# Altium footprint library LimeMicroAltiumLib_pcbLib_r05.PcbLib: 746 footprints (part 2 of 48)
Each footprint in its own frame and in the unit in brackets; x right, y up, seen from the top. Pads: shape width x height; smd on the part's side, far side on the other; paste and mask are expansions set on the pad; w line width, h text height; cw(c..) or ccw(c..) is an arc to the next point about the centre after c.
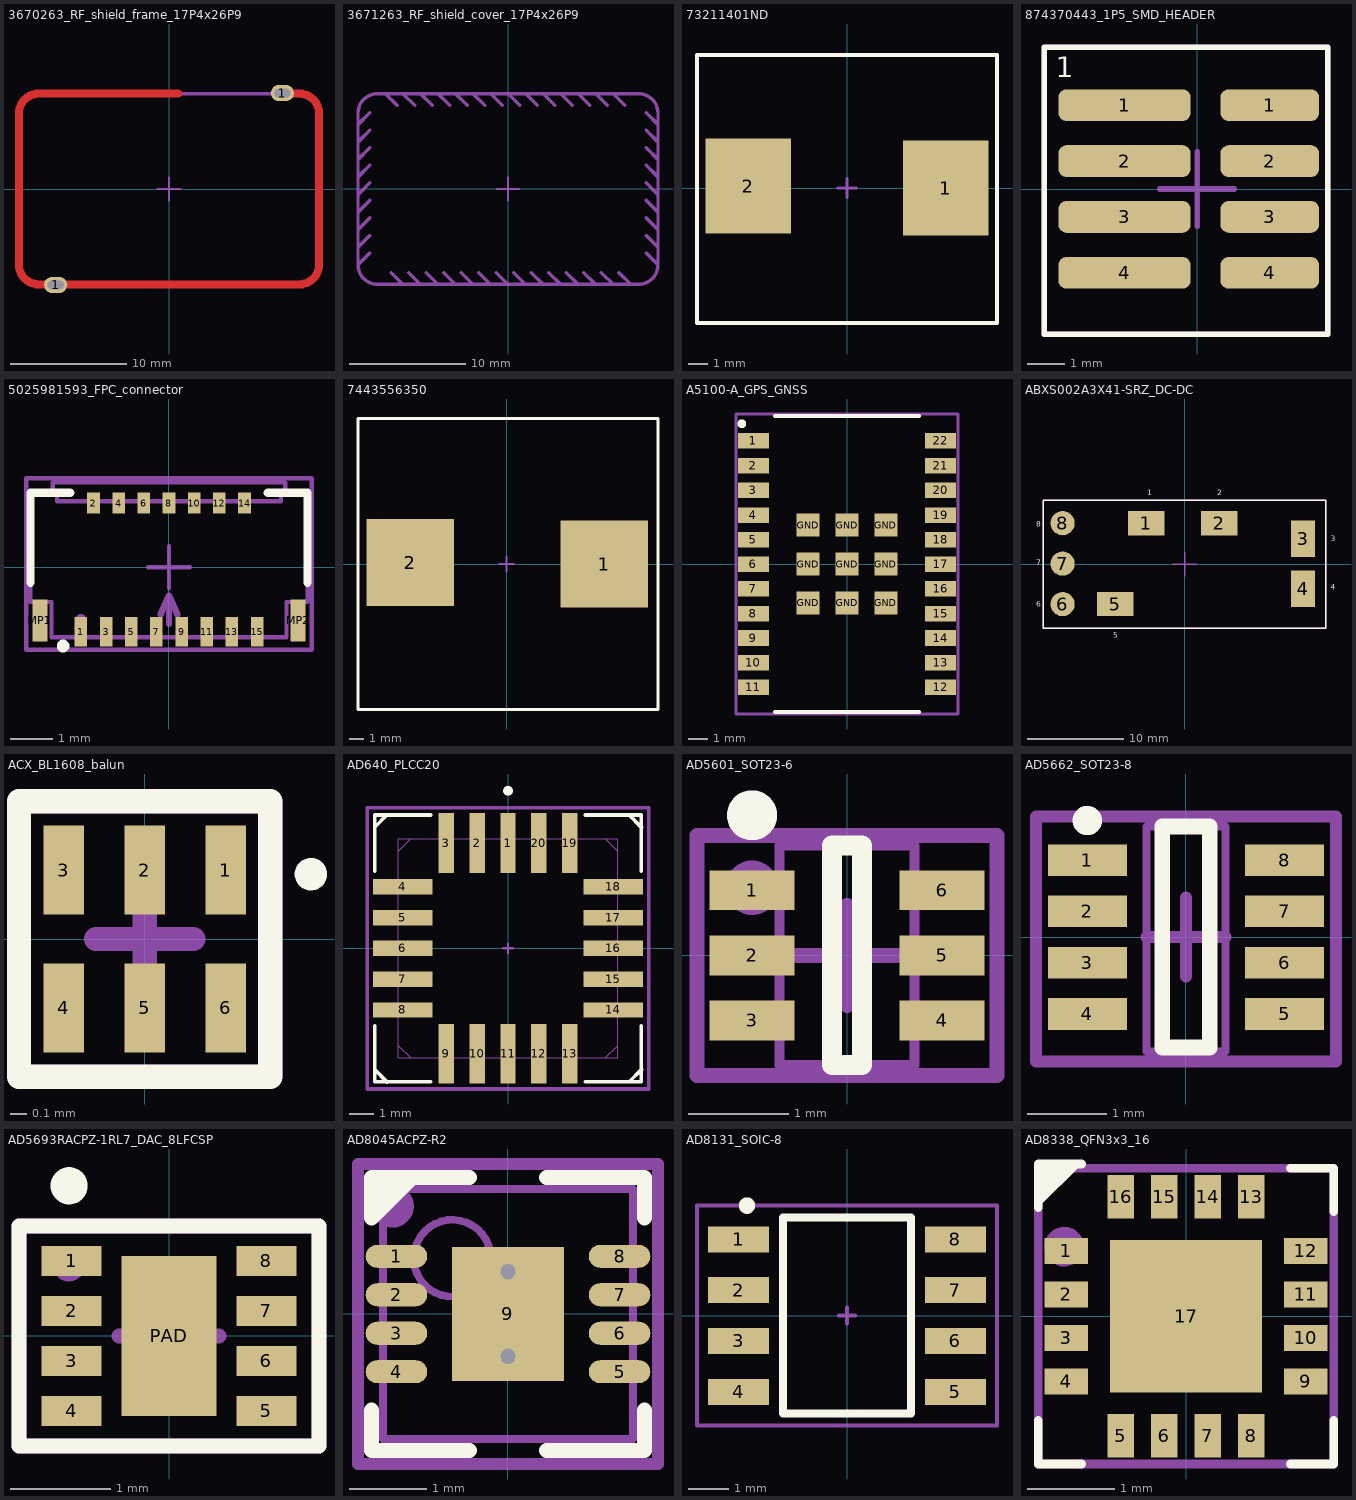
[diagram p1: the footprints below, top view; thin cyan lines are the x and y axes]

## 3670263_RF_shield_frame_17P4x26P9 [mm]
pads (2):
  oval 2x1.4 hole 0.7 slot 1.4 at 0 deg mask+0.05: 1(-9.75,-8.25) 1(9.75,8.25)
Top Layer:
  lines w0.7: 0.8,8.2 -11.207,8.2 ccw(c-11.207,6.507) -12.9,6.507 -12.9,-6.507 ccw(c-11.207,-6.507) -11.207,-8.2 11.207,-8.2 ccw(c11.207,-6.507) 12.9,-6.507 12.9,6.507 ccw(c11.207,6.507) 11.207,8.2 9.75,8.2
Mechanical 15:
  lines w0.15: -1,0 0,0 ; 0,-1 0,0 ; 0,1 0,0 ; 1,0 0,0
  lines w0.3: -12.9,-6.507 ccw(c-11.207,-6.507) -11.207,-8.2 11.207,-8.2 ccw(c11.207,-6.507) 12.9,-6.507 12.9,6.507 ccw(c11.207,6.507) 11.207,8.2 -11.207,8.2 ccw(c-11.207,6.507) -12.9,6.507 -12.9,-6.507
  text "RF shield frame" at -3.5,-7.7 h0.55
  text ".Designator" at 0,0 h0.55
3D body "STP_3670263 (rev1).stp": height 4.5, standoff -1.2, extent -13.15,-8.4 13.15,8.4

## 3671263_RF_shield_cover_17P4x26P9 [mm]
Mechanical 15:
  lines w0.15: -1,0 0,0 ; 0,-1 0,0 ; 0,1 0,0 ; 1,0 0,0
  lines w0.3: -12.9,-5 -11.9,-4 ; -12.9,-3.493 -11.9,-2.493 ; -12.9,-1.986 -11.9,-0.986 ; -12.9,-0.478 -11.9,0.522 ; -12.9,1.029 -11.9,2.029 ; -12.9,2.536 -11.9,3.536 ; -12.9,4.043 -11.9,5.043 ; -12.9,5.55 -11.9,6.55 ; -11.9,-5.507 -12.9,-6.507 ; -10.543,8.2 -9.543,7.2 ; -10.05,-7.2 -9.05,-8.2 ; -9.036,8.2 -8.036,7.2 ; -8.543,-7.2 -7.543,-8.2 ; -7.529,8.2 -6.529,7.2 ; -7.036,-7.2 -6.036,-8.2 ; -6.022,8.2 -5.022,7.2 ; -5.529,-7.2 -4.529,-8.2 ; -4.514,8.2 -3.514,7.2 ; -4.022,-7.2 -3.022,-8.2 ; -3.007,8.2 -2.007,7.2 ; -2.514,-7.2 -1.514,-8.2 ; -1.5,8.2 -0.5,7.2 ; -1.007,-7.2 -0.007,-8.2 ; 0.007,8.2 1.007,7.2 ; 0.5,-7.2 1.5,-8.2 ; 1.514,8.2 2.514,7.2 ; 2.007,-7.2 3.007,-8.2 ; 3.022,8.2 4.022,7.2 ; 3.514,-7.2 4.514,-8.2 ; 4.529,8.2 5.529,7.2 ; 5.022,-7.2 6.022,-8.2 ; 6.036,8.2 7.036,7.2 ; 6.529,-7.2 7.529,-8.2 ; 7.543,8.2 8.543,7.2 ; 8.036,-7.2 9.036,-8.2 ; 9.05,8.2 10.05,7.2 ; 9.543,-7.2 10.543,-8.2 ; 11.9,-5.507 12.9,-6.507 ; 11.9,-4 12.9,-5 ; 11.9,-2.493 12.9,-3.493 ; 11.9,-0.986 12.9,-1.986 ; 11.9,0.522 12.9,-0.478 ; 11.9,2.029 12.9,1.029 ; 11.9,3.536 12.9,2.536 ; 11.9,5.043 12.9,4.043 ; 11.9,6.55 12.9,5.55 ; -12.9,-6.507 ccw(c-11.207,-6.507) -11.207,-8.2 11.207,-8.2 ccw(c11.207,-6.507) 12.9,-6.507 ; -12.9,-6.507 -12.9,6.507 cw(c-11.207,6.507) -11.207,8.2 11.207,8.2 cw(c11.207,6.507) 12.9,6.507 12.9,-6.507
  text ".Designator" at 0,0 h0.55
  text "RF shield cover" at -3.5,6.4 h0.55
3D body "STP_3671263 (rev1).stp": height 4.9, standoff 0.9, extent -13.45,-8.7 13.45,8.7

## 73211401ND [mm]
pads (2):
  rect 4.5x5 smd: 1(5.2,0) 2(-5.2,0.1)
Top Overlay:
  lines w0.2: -7.9,-7.1 7.9,-7.1 7.9,7 -7.9,7 -7.9,-7.1
Mechanical 15:
  lines w0.15: -0.5,0 0.5,0 ; 0,-0.5 0,0.5 ; -7.9,-7.1 7.9,-7.1 7.9,7 -7.9,7 -7.9,-7.1
  text ".Designator" at 0,0 h0.55
3D body: height 6.5, standoff 0, extent -6.4,-6.4 6.4,6.4

## 874370443_1P5_SMD_HEADER [mm] "Supercapacitor 1.5mm pitch header"
pads (8):
  rrect50% 3.55x0.85 smd mask+0.05: 1(-1.95,2.25) 2(-1.95,0.75) 3(-1.95,-0.75) 4(-1.95,-2.25)
  rrect50% 2.65x0.85 smd mask+0.05: 1(1.95,2.25) 2(1.95,0.75) 3(1.95,-0.75) 4(1.95,-2.25)
Top Overlay:
  lines w0.15: -4.1,-3.9 3.5,-3.9 3.5,3.8 -4.1,3.8 -4.1,-3.9
  text "1" at -3.8,3 h0.55
Mechanical 15:
  lines w0.15: -1,0 0,0 ; 0,-1 0,0 ; 0,1 0,0 ; 1,0 0,0 ; -4.1,-3.9 3.5,-3.9 3.5,3.8 -4.1,3.8 -4.1,-3.9
  text "1" at -3.8,3 h0.55
  text ".Designator" at 0,0 h0.55
3D body "874370443.stp": height 5.77, standoff 0.02, extent -3.25,-3.7 2.75,3.6

## 5025981593_FPC_connector [mm]
pads (17):
  rect 0.3x0.7 smd mask+0.05: 1(-2.1,-1.532) 3(-1.5,-1.532) 5(-0.9,-1.532) 7(-0.3,-1.532) 9(0.3,-1.532) 11(0.9,-1.532) 13(1.5,-1.532) 15(2.1,-1.532)
  rect 0.3x0.5 smd mask+0.05: 2(-1.8,1.533) 4(-1.2,1.533) 6(-0.6,1.533) 8(0,1.533) 10(0.6,1.533) 12(1.2,1.533) 14(1.8,1.533)
  rect 0.35x1 smd mask+0.05: MP1(-3.075,-1.267) MP2(3.075,-1.267)
Top Overlay:
  circle w0.25: c-2.525,-1.875 r0.025
  lines w0.2: -3.3,-0.371 -3.3,1.775 -2.35,1.775 ; 2.35,1.775 3.3,1.775 3.3,-0.371
Mechanical 13:
  lines w0.1: -2.77,1.775 -2.77,2.025 2.77,2.025 2.77,1.775 ; -3.3,-0.825 -3.3,1.775 -2.67,1.775 -2.67,1.575 2.67,1.575 2.67,1.775 3.3,1.775 3.3,-0.825 2.8,-0.825 2.8,-1.667 -2.8,-1.667 -2.8,-0.825 -3.3,-0.825
Mechanical 15:
  circle w0.2: c-2.1,-1.25 r0.035
  lines w0.1: -0.5,0 0.5,0 ; 0,-0.5 0,0.5 ; -3.4,-1.967 3.4,-1.967 3.4,2.125 -3.4,2.125 -3.4,-1.967
  lines w0.15: -0.2,-1.125 0,-0.675 ; 0,-1.35 0,-0.675 ; 0.2,-1.125 0,-0.675
  text "Connector input" at -2.875,-1.8 h0.4
  text ".Designator" at 0,0 h0.55
3D body "5025981593.stp": height 1.16, standoff 0.01, extent -3.3,-1.775 3.3,2.025

## 7443556350 [mm]
pads (2):
  rect 6x6 smd: 1(6.7,0) 2(-6.6,0.1)
Top Overlay:
  lines w0.2: -10.2,-10 -10.2,10 10.4,10 10.4,-10 -10.2,-10
Mechanical 15:
  lines w0.15: -0.5,0 0.5,0 ; 0,-0.5 0,0.5 ; -10.2,-10 -10.2,10 10.4,10 10.4,-10 -10.2,-10
  text ".Designator" at 0,0 h0.55
3D body: height 9, standoff 0, extent -9.1,-9.1 9.1,9.1

## A5100-A_GPS_GNSS [mm] "RF Receiver 1.575GHz -165dBm 115.2kBaud Module"
pads (31):
  rect 1.6x0.8 smd mask+0.05: 1(-4.8,6.32) 2(-4.8,5.05) 3(-4.8,3.78) 4(-4.8,2.51) 5(-4.8,1.24) 6(-4.8,-0.01) 7(-4.8,-1.28) 8(-4.8,-2.55) 9(-4.8,-3.8) 10(-4.8,-5.07) 11(-4.8,-6.32) 12(4.8,-6.32) 13(4.8,-5.07) 14(4.8,-3.8) 15(4.8,-2.55) 16(4.8,-1.28) 17(4.8,-0.01) 18(4.8,1.24) 19(4.8,2.51) 20(4.8,3.78) 21(4.8,5.05) 22(4.8,6.32)
  rect 1.2x1.2 smd mask+0.05: GND(-2,-2) GND(-2,0) GND(-2,2) GND(0,-2) GND(0,0) GND(0,2) GND(2,-2) GND(2,0) GND(2,2)
Top Overlay:
  circle w0.25: c-5.4,7.2 r0.1
  lines w0.2: -3.7,-7.6 3.7,-7.6 ; -3.7,7.6 3.7,7.6
Mechanical 15:
  circle w0.25: c-4.8,6.2 r0.1
  lines w0.15: -0.5,0 0.5,0 ; 0,-0.5 0,0.5 ; -5.7,-7.7 -5.7,7.7 5.7,7.7 5.7,-7.7 -5.7,-7.7
  text ".Designator" at 0.025,0 h0.55
  text "Stencil thickness:  / 120um-150um" at -1,-5.1 h0.55
3D body: height 2.51, standoff 0, extent -3.488,5.003 -2.094,6.4
3D body: height 2.5, standoff 1.6, extent -4,-7 4,7
3D body: height 1.6, standoff 0, extent -5.1,-7.5 5.1,7.5

## ABXS002A3X41-SRZ_DC-DC [mm]
pads (8):
  rect 3.78x2.51 smd mask+0.05: 1(-3.975,4.255) 2(3.615,4.255) 5(-7.155,-4.125)
  rect 2.51x3.78 smd mask+0.05: 3(12.265,2.645) 4(12.265,-2.535)
  round 2.51 smd mask+0.05: 6(-12.625,-4.125) 7(-12.625,0.065) 8(-12.625,4.255)
Top Overlay:
  lines w0.15: -14.625,-6.625 -14.625,6.625 14.625,6.625 14.625,-6.625 -14.625,-6.625
  text "1" at -3.875,7.125 h0.55
  text "2" at 3.375,7.125 h0.55
  text "3" at 15.125,2.375 h0.55
  text "4" at 15.125,-2.625 h0.55
  text "5" at -7.375,-7.625 h0.55
  text "6" at -15.375,-4.375 h0.55
  text "7" at -15.375,-0.125 h0.55
  text "8" at -15.375,3.875 h0.55
Mechanical 15:
  lines w0.15: -1.25,0 0,0 ; 0,-1.25 0,0 ; 0,1.25 0,0 ; 1.25,0 0,0 ; -14.625,-6.625 -14.625,6.625 14.625,6.625 14.625,-6.625 -14.625,-6.625
  text "8" at -12.875,3.875 h0.55
  text "7" at -12.875,-0.125 h0.55
  text "6" at -12.875,-4.375 h0.55
  text "5" at -7.25,-4.25 h0.55
  text "4" at 12.125,-2.625 h0.55
  text "3" at 12.125,2.375 h0.55
  text "2" at 3.125,4.125 h0.55
  text "1" at -4.125,4.125 h0.55
  text ".Designator" at 0,0 h0.55
3D body "ABXS002A3X41-SRZ--3DModel-STEP-56544.STEP": height 7.52, standoff 0.03, extent -14.095,-5.65 13.845,5.78

## ACX_BL1608_balun [mm]
pads (6):
  rect 0.25x0.55 smd mask+0.05: 1(0.5,0.425) 2(0,0.425) 3(-0.5,0.425) 4(-0.5,-0.425) 5(0,-0.425) 6(0.5,-0.425)
Top Overlay:
  circle w0.1: c1.025,0.4 r0.05
  lines w0.15: -0.775,-0.85 0.775,-0.85 0.775,0.85 -0.775,0.85 -0.775,-0.85
Mechanical 15:
  circle w0.1: c0.5,0.475 r0.05
  lines w0.15: -0.3,0 0,0 ; 0,-0.3 0,0 ; 0,0.3 0,0 ; 0.3,0 0,0 ; -0.775,-0.85 -0.775,0.85 0.775,0.85 0.775,-0.85 -0.775,-0.85
  text ".Designator" at 0,0 h0.55
3D body: height 0.6, standoff 0, extent 0.4,-0.075 0.6,0.15
3D body: height 0.6, standoff 0, extent -0.6,0.275 -0.4,0.425
3D body: height 0.6, standoff 0, extent -0.1,0.275 0.1,0.425
3D body: height 0.6, standoff 0, extent 0.4,0.275 0.6,0.425
3D body: height 0.6, standoff 0, extent 0.4,-0.425 0.6,-0.275
3D body: height 0.6, standoff 0, extent -0.1,-0.425 0.1,-0.275
3D body: height 0.6, standoff 0, extent -0.6,-0.425 -0.4,-0.275
3D body: height 0.6, standoff 0, extent -0.8,-0.4 0.8,0.4

## AD640_PLCC20 [mil]
pads (20):
  rect 25x97 smd mask+1.97: 1(0,171) 2(-50,171) 3(-100,171) 9(-100,-171) 10(-50,-171) 11(0,-171) 12(50,-171) 13(100,-171) 19(100,171) 20(50,171)
  rect 97x25 smd mask+1.97: 4(-171,100) 5(-171,50) 6(-171,0) 7(-171,-50) 8(-171,-100) 14(171,-100) 15(171,-50) 16(171,0) 17(171,50) 18(171,100)
Top Overlay:
  circle w10: c0,255.91 r2.95
  lines w6: -216.54,-196.85 -196.54,-216.85 ; -216.54,-125.5 -216.54,-216.54 -125.5,-216.54 ; -216.54,125.5 -216.54,216.54 -125.5,216.54 ; -216.54,196.85 -196.54,216.85 ; 125.5,-216.54 216.54,-216.54 216.54,-125.5 ; 125.5,216.54 216.54,216.54 216.54,125.5 ; 196.85,-216.54 216.85,-196.54 ; 196.85,216.54 216.85,196.54
Mechanical 13:
  lines w2: -178,-158 -158,-178 ; -178,158 -158,178 ; 158,-178 178,-158 ; 158,178 178,158 ; -197.5,-110.5 -197.5,-89.5 -178,-89.5 -178,-110.5 -197.5,-110.5 ; -197.5,-60.5 -197.5,-39.5 -178,-39.5 -178,-60.5 -197.5,-60.5 ; -197.5,-10.5 -197.5,10.5 -178,10.5 -178,-10.5 -197.5,-10.5 ; -197.5,39.5 -197.5,60.5 -178,60.5 -178,39.5 -197.5,39.5 ; -197.5,89.5 -197.5,110.5 -178,110.5 -178,89.5 -197.5,89.5 ; -178,-178 178,-178 178,178 -178,178 -178,-178 ; -110.5,-197.5 -110.5,-178 -89.5,-178 -89.5,-197.5 -110.5,-197.5 ; -110.5,178 -89.5,178 -89.5,197.5 -110.5,197.5 -110.5,178 ; -60.5,-197.5 -60.5,-178 -39.5,-178 -39.5,-197.5 -60.5,-197.5 ; -60.5,178 -39.5,178 -39.5,197.5 -60.5,197.5 -60.5,178 ; -10.5,-197.5 -10.5,-178 10.5,-178 10.5,-197.5 -10.5,-197.5 ; -10.5,178 10.5,178 10.5,197.5 -10.5,197.5 -10.5,178 ; 39.5,-197.5 39.5,-178 60.5,-178 60.5,-197.5 39.5,-197.5 ; 39.5,178 60.5,178 60.5,197.5 39.5,197.5 39.5,178 ; 89.5,-197.5 89.5,-178 110.5,-178 110.5,-197.5 89.5,-197.5 ; 89.5,178 110.5,178 110.5,197.5 89.5,197.5 89.5,178 ; 178,-110.5 178,-89.5 197.5,-89.5 197.5,-110.5 178,-110.5 ; 178,-60.5 178,-39.5 197.5,-39.5 197.5,-60.5 178,-60.5 ; 178,-10.5 178,10.5 197.5,10.5 197.5,-10.5 178,-10.5 ; 178,39.5 178,60.5 197.5,60.5 197.5,39.5 178,39.5 ; 178,89.5 178,110.5 197.5,110.5 197.5,89.5 178,89.5
Mechanical 15:
  circle w10: c0,171.26 r2.95
  lines w3.94: -7.87,0 0,0 ; 0,-7.87 0,0 ; 0,7.87 0,0 ; 7.87,0 0,0
  lines w6: -228.35,-228.35 -228.35,228.35 228.35,228.35 228.35,-228.35 -228.35,-228.35
  text ".Designator" at 0,0 h21.65
3D body: height 10, standoff 0, extent 0,0 10,10
3D body "P_20A-M.step": height 199.8, standoff 0.18, extent -197.48,-197.48 197.48,197.48

## AD5601_SOT23-6 [mm] "SOT23, 6-Leads, Body 2x1.3mm, Pitch 0.65mm, Lead Span 2.1mm, IPC Medium Density"
height 1.1
pads (6):
  rect 0.85x0.4 smd mask+0.05: 1(-0.95,0.65) 2(-0.95,0) 3(-0.95,-0.65) 4(0.95,-0.65) 5(0.95,0) 6(0.95,0.65)
Top Overlay:
  circle w0.25: c-0.95,1.4 r0.125
  lines w0.2: -0.15,-1.1 -0.15,1.1 0.15,1.1 0.15,-1.1 -0.15,-1.1
Mechanical 13:
  lines w0.1: -0.675,-1.1 0.675,-1.1 0.675,1.1 -0.675,1.1 -0.675,-1.1
Mechanical 15:
  circle w0.4: c-0.95,0.675 r0.071
  lines w0.15: -0.5,0 0.5,0 ; 0,-0.5 0,0.5 ; -1.5,-1.2 1.5,-1.2 1.5,1.2 -1.5,1.2 -1.5,-1.2
3D body "User Library-SC70-6.step": height 0.43, standoff -0.53, extent -1.05,-1 1.05,1

## AD5662_SOT23-8 [mm]
pads (8):
  rect 1x0.4 smd mask+0.05: 1(-1.25,0.975) 2(-1.25,0.325) 3(-1.25,-0.325) 4(-1.25,-0.975) 5(1.25,-0.975) 6(1.25,-0.325) 7(1.25,0.325) 8(1.25,0.975)
Top Overlay:
  circle w0.3: c-1.25,1.475 r0.035
  lines w0.2: -0.3,-1.4 0.3,-1.4 0.3,1.4 -0.3,1.4 -0.3,-1.4
Mechanical 13:
  lines w0.1: -0.5,-1.45 -0.5,1.4 0.5,1.4 0.5,-1.45 -0.5,-1.45
Mechanical 15:
  circle w0.2: c-1.275,0.975 r0.056
  lines w0.15: -0.5,0 0.5,0 ; 0,-0.5 0,0.5 ; -1.9,-1.575 -1.9,1.525 1.9,1.525 1.9,-1.575 -1.9,-1.575
  text ".Designator" at 0,0 h0.55
3D body "User Library-sot238.step": height 1.2, standoff 0, extent -1.4,-1.49 1.4,1.45

## AD5693RACPZ-1RL7_DAC_8LFCSP [mm]
pads (9):
  rect 0.6x0.3 smd mask+0.05: 1(-0.975,0.75) 2(-0.975,0.25) 3(-0.975,-0.25) 4(-0.975,-0.75) 5(0.975,-0.75) 6(0.975,-0.25) 7(0.975,0.25) 8(0.975,0.75)
  rect 0.95x1.6 smd mask+0.05: PAD(0,0)
Top Overlay:
  circle w0.3: c-1,1.5 r0.035
  lines w0.15: -1.5,-1.1 1.5,-1.1 1.5,1.1 -1.5,1.1 -1.5,-1.1
Mechanical 15:
  circle w0.2: c-1,0.7 r0.056
  lines w0.15: -0.5,0 0.5,0 ; 0,-0.5 0,0.5 ; -1.5,-1.1 -1.5,1.1 1.5,1.1 1.5,-1.1 -1.5,-1.1
  text ".Designator" at 0,0 h0.55
3D body "User Library-lfcsp-8-2.step": height 0.55, standoff -0.02, extent -1.025,-1 1.015,1

## AD8045ACPZ-R2 [mm] "QFN, 8-Leads, Body 3x3mm, Pitch 0.5mm, Thermal Pad 1.45X1.74mm, IPC High Density"
height 0.9
pads (9):
  oval 0.8x0.3 smd mask+0.05: 1(-1.45,0.75) 2(-1.45,0.25) 3(-1.45,-0.25) 4(-1.45,-0.75) 5(1.45,-0.75) 6(1.45,-0.25) 7(1.45,0.25) 8(1.45,0.75)
  rect 1.45x1.74 smd: 9(0,0)
via 0,-0.55 diameter 0.5 hole 0.2
via 0,0.55 diameter 0.5 hole 0.2
Top Overlay:
  region: -1.775,1.25 -1.775,1.75 -1.275,1.75
  lines w0.2: -1.775,-1.25 -1.775,-1.775 -0.5,-1.775 ; -1.275,1.75 -1.775,1.25 -1.775,1.775 -0.5,1.775 ; 0.5,-1.775 1.775,-1.775 1.775,-1.25 ; 0.5,1.775 1.775,1.775 1.775,1.25
Mechanical 13:
  circle w0.1: c-0.725,0.725 r0.5
  lines w0.1: -1.625,-1.625 1.625,-1.625 1.625,1.625 -1.625,1.625 -1.625,-1.625
Mechanical 15:
  circle w0.35: c-1.5,1.4 r0.1
  lines w0.15: -0.5,0 0.5,0 ; 0,-0.5 0,0.5 ; -1.95,-1.95 1.95,-1.95 1.95,1.95 -1.95,1.95 -1.95,-1.95
  text ".Designator" at 0,0 h0.55
3D body "User Library-AD8137 lfcsp.step": height 0.9, standoff -0.04, extent -1.476,-1.5 1.526,1.5

## AD8131_SOIC-8 [mm]
pads (8):
  rect 1.525x0.65 smd: 1(-2.712,1.905) 2(-2.712,0.635) 3(-2.712,-0.635) 4(-2.712,-1.905) 5(2.712,-1.905) 6(2.712,-0.635) 7(2.712,0.635) 8(2.712,1.905)
Top Overlay:
  circle w0.254: c-2.5,2.75 r0.079
  lines w0.2: -1.6,-2.45 1.6,-2.45 1.6,2.45 -1.6,2.45 -1.6,-2.45
Mechanical 15:
  circle w0.254: c-2.675,1.925 r0.079
  lines w0.1: -0.2,0 0,0 ; 0,-0.2 0,0 ; 0,0.2 0,0 ; 0.2,0 0,0 ; -3.75,-2.75 3.75,-2.75 3.75,2.75 -3.75,2.75 -3.75,-2.75
  text ".Designator" at 0,0 h0.55
3D body "AD8131ARZ.stp": height 1.75, standoff 0, extent -3,-2.45 3,2.45

## AD8338_QFN3x3_16 [mm]
pads (17):
  rect 0.5x0.3 smd mask+0.05: 1(-1.375,0.75) 2(-1.375,0.25) 3(-1.375,-0.25) 4(-1.375,-0.75) 9(1.375,-0.75) 10(1.375,-0.25) 11(1.375,0.25) 12(1.375,0.75)
  rect 0.3x0.5 smd mask+0.05: 5(-0.75,-1.375) 6(-0.25,-1.375) 7(0.25,-1.375) 8(0.75,-1.375) 13(0.75,1.375) 14(0.25,1.375) 15(-0.25,1.375) 16(-0.75,1.375)
  rect 1.75x1.75 smd mask+0.05: 17(0,0)
Top Overlay:
  region: -1.7,1.25 -1.2,1.75 -1.7,1.75
  lines w0.1: -1.7,-1.2 -1.7,-1.7 -1.2,-1.7 ; -1.7,1.25 -1.7,1.75 -1.2,1.75 ; 1.2,-1.7 1.7,-1.7 1.7,-1.2 ; 1.2,1.7 1.7,1.7 1.7,1.2
Mechanical 15:
  circle w0.254: c-1.4,0.8 r0.1
  lines w0.1: -0.2,0 0,0 ; 0,-0.2 0,0 ; 0,0.2 0,0 ; 0.2,0 0,0 ; -1.7,-1.7 -1.7,1.7 1.7,1.7 1.7,-1.7 -1.7,-1.7
  text ".Designator" at 0,0 h0.55
3D body "AD8338ACPZ-R7.stp": height 0.8, standoff 0, extent -1.55,-1.55 1.55,1.55